# Altium footprint library ConnectMedical.PcbLib: 93 footprints (part 6 of 6)
Each footprint in its own frame and in the unit in brackets; x right, y up, seen from the top. Pads: shape width x height; smd on the part's side, far side on the other; paste and mask are expansions set on the pad; w line width, h text height; cw(c..) or ccw(c..) is an arc to the next point about the centre after c.
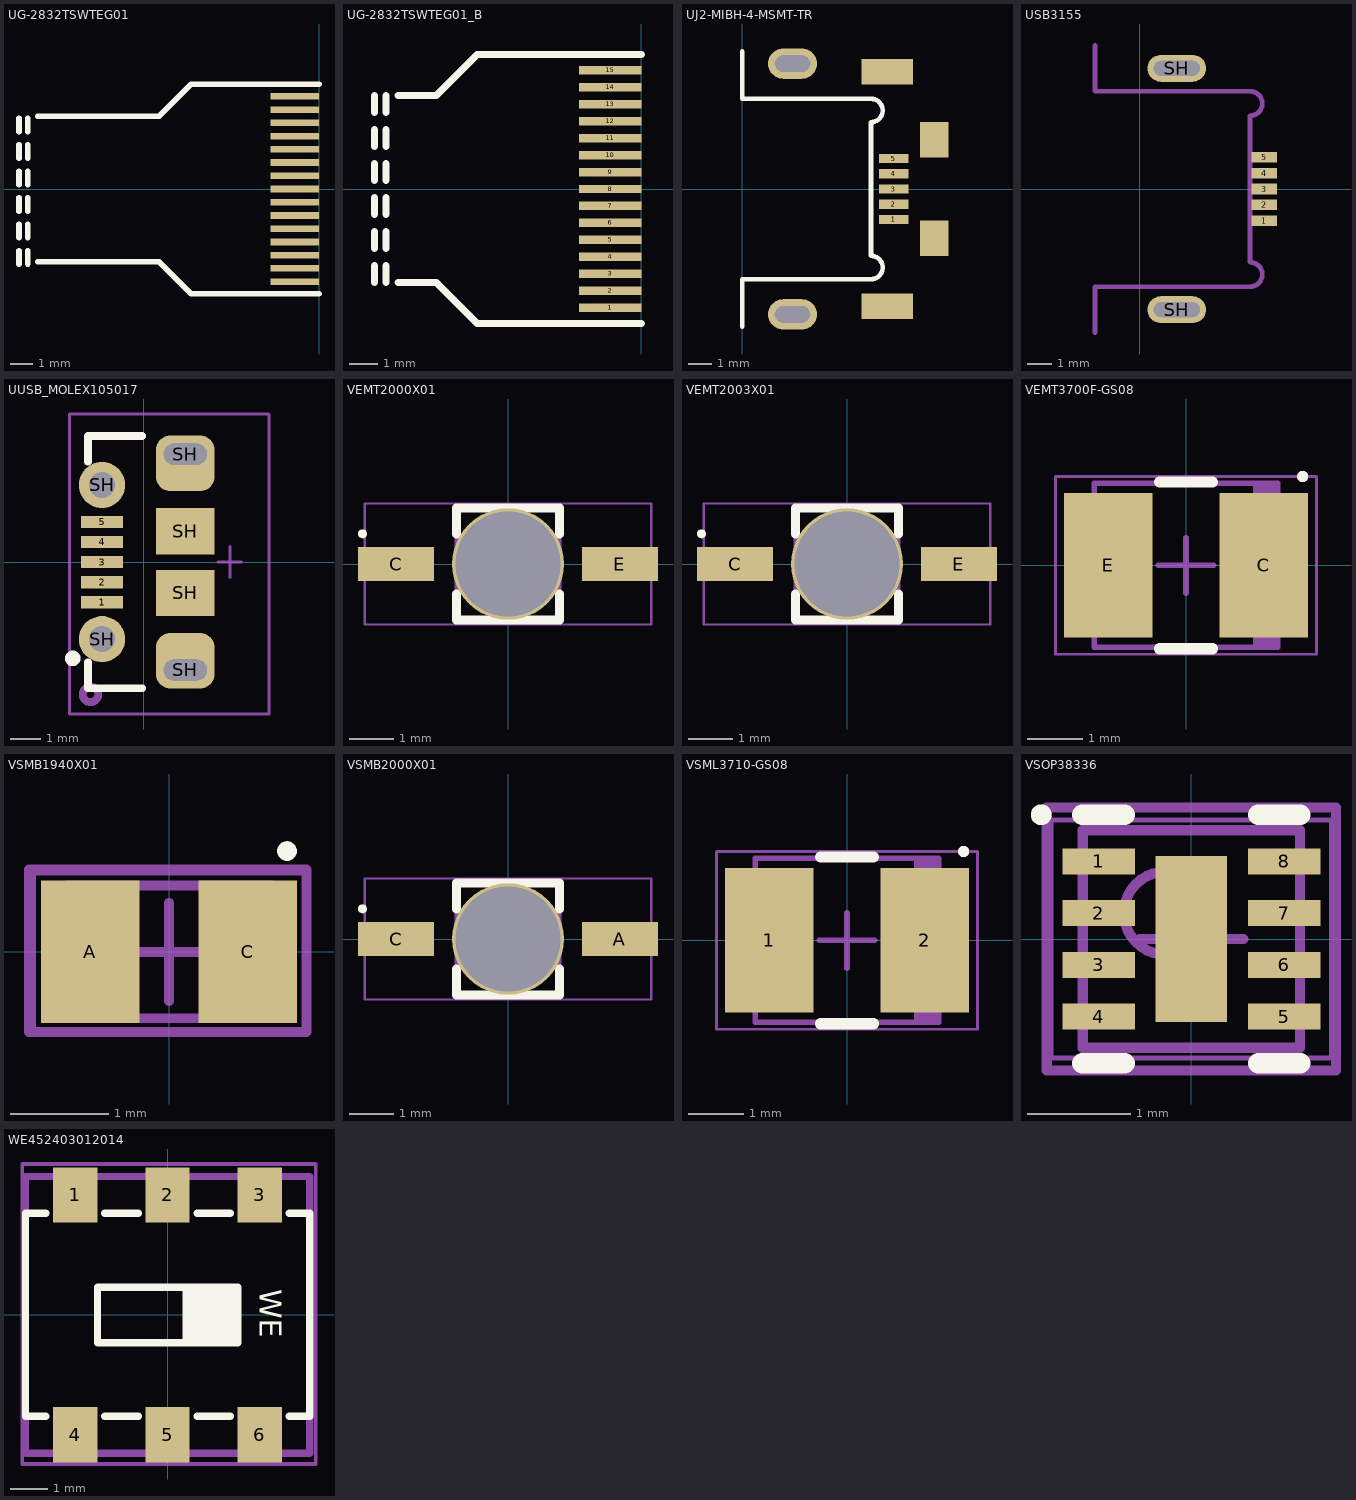
[diagram p5: the footprints below, top view; thin cyan lines are the x and y axes]

## UG-2832TSWTEG01 [mm] "OLED Display"
pads (15):
  rect 2.2x0.3 smd: 1(-1.1,-4.2) 2(-1.1,-3.6) 3(-1.1,-3) 4(-1.1,-2.4) 5(-1.1,-1.8) 6(-1.1,-1.2) 7(-1.1,-0.6) 8(-1.1,0) 9(-1.1,0.6) 10(-1.1,1.2) 11(-1.1,1.8) 12(-1.1,2.4) 13(-1.1,3) 14(-1.1,3.6) 15(-1.1,4.2)
Top Overlay:
  lines w0.254: -13.6,-3.4 -13.6,-2.8 ; -13.6,-2.2 -13.6,-1.6 ; -13.6,-1 -13.6,-0.4 ; -13.6,0.2 -13.6,0.8 ; -13.6,1.4 -13.6,2 ; -13.6,2.6 -13.6,3.2 ; -13.2,-3.4 -13.2,-2.8 ; -13.2,-2.2 -13.2,-1.6 ; -13.2,-1 -13.2,-0.4 ; -13.2,0.2 -13.2,0.8 ; -13.2,1.4 -13.2,2 ; -13.2,2.6 -13.2,3.2 ; -12.75,-3.3 -7.25,-3.3 -5.8,-4.75 0,-4.75 ; -12.75,3.3 -7.25,3.3 -5.8,4.75 0,4.75

## UG-2832TSWTEG01_B [mm] "OLED Display"
pads (15):
  rect 2.2x0.3 smd: 1(-1.1,-4.2) 2(-1.1,-3.6) 3(-1.1,-3) 4(-1.1,-2.4) 5(-1.1,-1.8) 6(-1.1,-1.2) 7(-1.1,-0.6) 8(-1.1,0) 9(-1.1,0.6) 10(-1.1,1.2) 11(-1.1,1.8) 12(-1.1,2.4) 13(-1.1,3) 14(-1.1,3.6) 15(-1.1,4.2)
Top Overlay:
  lines w0.254: -9.425,-3.3 -9.425,-2.7 ; -9.425,-2.1 -9.425,-1.5 ; -9.425,-0.9 -9.425,-0.3 ; -9.425,0.3 -9.425,0.9 ; -9.425,1.5 -9.425,2.1 ; -9.425,2.7 -9.425,3.3 ; -9.025,-3.3 -9.025,-2.7 ; -9.025,-2.1 -9.025,-1.5 ; -9.025,-0.9 -9.025,-0.3 ; -9.025,0.3 -9.025,0.9 ; -9.025,1.5 -9.025,2.1 ; -9.025,2.7 -9.025,3.3 ; -8.6,-3.3 -7.25,-3.3 -5.8,-4.75 0,-4.75 ; -8.6,3.3 -7.25,3.3 -5.8,4.75 0,4.75

## UJ2-MIBH-4-MSMT-TR [mm] "USB Connector"
pads (11):
  rect 1.25x0.4 smd: 1(6.475,-1.3) 2(6.475,-0.65) 3(6.475,0) 4(6.475,0.65) 5(6.475,1.3)
  oval 2.1x1.3 hole 0.7 slot 1.5 at 0 deg: ""(2.15,-5.35) ""(2.15,5.35)
  rect 2.2x1.1 smd: ""(6.2,-5) ""(6.2,5)
  rect 1.2x1.5 smd: ""(8.2,-2.1) ""(8.2,2.1)
Top Overlay:
  lines w0.2: 0,-5.875 0,-3.85 5.5,-3.85 ccw(c5.5,-3.35) 5.5,-2.85 5.5,2.85 ccw(c5.5,3.35) 5.5,3.85 0,3.85 0,5.875
3D body "UJ2-MIBH-4-MSMT_AP203.stp": height 0.9, standoff -1.81, extent 0.025,-5.5 8.725,5.5

## USB3155 [mm] "USB Connector"
pads (7):
  rect 1.05x0.43 smd mask+0.07: 1(5.1,-1.3) 2(5.1,-0.65) 3(5.1,0) 4(5.1,0.65) 5(5.1,1.3)
  oval 2.4x1.1 hole 0.6 slot 1.9 at 0 deg: SH(1.52,-4.94) SH(1.52,4.94)
Mechanical 15:
  lines w0.2: -1.83,-5.875 -1.83,-4 4.52,-4 ccw(c4.52,-3.5) 4.52,-3 4.52,3 ccw(c4.52,3.5) 4.52,4 -1.83,4 -1.83,5.875
3D body "USB3155-30-A_revB v1.step": height 0.31, standoff -2.5, extent -1.143,-5.09 5.275,5.09

## UUSB_MOLEX105017 [mm] "Micro-USB Molex 105017-0001 B Receptacle, Solder Tab, Lead-Free"
height 2.7
pads (11):
  rect 1.35x0.4 smd mask+0.102: 1(-1.35,-1.3)
  rect 1.35x0.4 smd: 2(-1.35,-0.65) 3(-1.35,0) 4(-1.35,0.65) 5(-1.35,1.3)
  round 1.5 hole 0.85: SH(-1.35,-2.5) SH(-1.35,2.5)
  rrect50% 1.9x1.8 hole 0.7 slot 1.4 at 0 deg copper offset 0,0.3 mask+0.102: SH(1.35,-3.5)
  rect 1.9x1.5 smd: SH(1.35,-1) SH(1.35,1)
  rrect50% 1.9x1.8 hole 0.7 slot 1.4 at 0 deg copper offset 0,-0.3 mask+0.102: SH(1.35,3.5)
Top Overlay:
  circle w0.254: c-2.3,-3.125 r0.125
  lines w0.254: -1.8,-3.25 -1.8,-4.09 -0.05,-4.09 ; -1.8,3.25 -1.8,4.09 -0.05,4.09
Mechanical 14:
  circle w0.254: c-1.723,-4.293 r0.251
  lines w0.1: -2.409,-4.928 4.068,-4.928 4.068,4.775 4.043,4.801 -2.409,4.801 -2.409,-4.928
  text ".designator" at -0.332,-0.497 h0.76
Mechanical 15:
  lines w0.1: 2.417,0 3.179,0 ; 2.8,-0.5 2.8,0.5 ; -2.409,-4.928 -2.409,4.801 4.043,4.801 4.068,4.775 4.068,-4.928 -2.409,-4.928
3D body "1050170001.stp": height 2.68, standoff -0.62, extent -1.492,-4.075 3.908,4.125

## VEMT2000X01 [mm] "Silicon NPN Phototransistor, 2-Leads, Body 2.30x5.80mm, IPC High Density"
height 2.97
pads (3):
  rect 1.7x0.75 smd: C(-2.5,0) E(2.5,0)
  round 2.5 hole 2.35: ""(0,0)
Top Overlay:
  circle w0.1: c-3.25,0.675 r0.05
  lines w0.2: -1.15,-0.675 -1.15,-1.25 1.15,-1.25 1.15,-0.675 ; -1.15,0.675 -1.15,1.25 1.15,1.25 1.15,0.675
Mechanical 13:
  lines w0.1: -1.15,-1.25 1.15,-1.25 1.15,1.25 -1.15,1.25 -1.15,-1.25
Mechanical 15:
  lines w0.05: -3.2,-1.35 3.2,-1.35 3.2,1.35 -3.2,1.35 -3.2,-1.35
  lines w0.1: -0.5,0 0.5,0 ; 0,-0.5 0,0.5
3D body "VEMT2000x01.step": height 1.8, standoff -0.97, extent -2.9,-1.15 2.9,1.15

## VEMT2003X01 [mm] "Silicon NPN Phototransistor, SODFL, 2-Leads, Body 2.30x5.80mm, IPC High Density"
height 2.75
pads (3):
  rect 1.7x0.75 smd: C(-2.5,0) E(2.5,0)
  round 2.5 hole 2.35: ""(0,0)
Top Overlay:
  circle w0.1: c-3.25,0.675 r0.05
  lines w0.2: -1.15,-0.675 -1.15,-1.25 1.15,-1.25 1.15,-0.675 ; -1.15,0.675 -1.15,1.25 1.15,1.25 1.15,0.675
Mechanical 13:
  lines w0.1: -1.15,-1.25 1.15,-1.25 1.15,1.25 -1.15,1.25 -1.15,-1.25
Mechanical 15:
  lines w0.05: -3.2,-1.35 3.2,-1.35 3.2,1.35 -3.2,1.35 -3.2,-1.35
  lines w0.1: -0.5,0 0.5,0 ; 0,-0.5 0,0.5
3D body "VEMT2003x01.step": height 1.6, standoff -0.95, extent -2.9,-1.15 2.9,1.15

## VEMT3700F-GS08 [mm] "Silicon NPN Phototransistor, 2-Leads, Body 3.50x2.80mm, IPC High Density"
height 1.85
pads (2):
  rect 1.6x2.6 smd: C(1.4,0) E(-1.4,0)
Top Overlay:
  circle w0.1: c2.1,1.6 r0.05
  lines w0.2: -0.475,-1.5 0.475,-1.5 ; -0.475,1.5 0.475,1.5
Mechanical 13:
  rectangle: 1.206,-1.475 1.65,1.475
  lines w0.1: -1.65,-1.475 -1.65,1.475 1.65,1.475 1.65,-1.475 -1.65,-1.475
Mechanical 15:
  lines w0.05: -2.35,-1.6 -2.35,1.6 2.35,1.6 2.35,-1.6 -2.35,-1.6
  lines w0.1: -0.5,0 0.5,0 ; 0,-0.5 0,0.5
3D body "VSML3710-GS08.step": height 1.85, standoff 0, extent -1.87,-1.475 1.87,1.475

## VSMB1940X01 [mm] "High Speed Infrared Emitting Diode, 2-Leads, Body 2.00x1.25mm, IPC High Density"
height 0.95
pads (2):
  rect 1x1.45 smd: A(-0.8,0) C(0.8,0)
Top Overlay:
  circle w0.1: c1.2,1.025 r0.05
Mechanical 13:
  rectangle: 0.768,-0.675 1.05,0.675
  lines w0.1: -1.05,-0.675 1.05,-0.675 1.05,0.675 -1.05,0.675 -1.05,-0.675
Mechanical 14:
  lines w0.1: -1.422,-0.813 1.397,-0.813 1.397,0.838 -1.422,0.838 -1.422,-0.813
  text "'.Designator'" at -1.676,-0.381 h0.76
Mechanical 15:
  lines w0.05: -1.375,-0.8 1.375,-0.8 1.375,0.8 -1.375,0.8 -1.375,-0.8
  lines w0.1: -0.5,0 0.5,0 ; 0,-0.5 0,0.5
3D body "TEMD7100X01 .step": height 0.95, standoff 0, extent -1.27,-0.675 1.27,0.675

## VSMB2000X01 [mm] "High Speed Infrared Emitting Diodes, 2-Leads, Body 2.30x5.80mm, IPC High Density"
height 2.97
pads (3):
  rect 1.7x0.75 smd: A(2.5,0) C(-2.5,0)
  round 2.5 hole 2.35: ""(0,0)
Top Overlay:
  circle w0.1: c-3.25,0.675 r0.05
  lines w0.2: -1.15,-0.675 -1.15,-1.25 1.15,-1.25 1.15,-0.675 ; -1.15,0.675 -1.15,1.25 1.15,1.25 1.15,0.675
Mechanical 13:
  lines w0.1: -1.15,-1.25 -1.15,1.25 1.15,1.25 1.15,-1.25 -1.15,-1.25
Mechanical 15:
  lines w0.05: -3.2,-1.35 -3.2,1.35 3.2,1.35 3.2,-1.35 -3.2,-1.35
  lines w0.1: -0.5,0 0.5,0 ; 0,-0.5 0,0.5
3D body "VEMB2000x01.step": height 1.8, standoff -0.97, extent -2.9,-1.15 2.9,1.15

## VSML3710-GS08 [mm] "High Power Infrared Emitting Diode, 2-Leads, Body 3.50x2.80mm, IPC High Density"
height 1.85
pads (2):
  rect 1.6x2.6 smd: 1(-1.4,0) 2(1.4,0)
Top Overlay:
  circle w0.1: c2.1,1.6 r0.05
  lines w0.2: -0.475,-1.5 0.475,-1.5 ; -0.475,1.5 0.475,1.5
Mechanical 13:
  rectangle: 1.206,-1.475 1.65,1.475
  lines w0.1: -1.65,-1.475 -1.65,1.475 1.65,1.475 1.65,-1.475 -1.65,-1.475
Mechanical 15:
  lines w0.05: -2.35,-1.6 -2.35,1.6 2.35,1.6 2.35,-1.6 -2.35,-1.6
  lines w0.1: -0.5,0 0.5,0 ; 0,-0.5 0,0.5
3D body "VSML3710-GS08.step": height 1.85, standoff 0, extent -1.87,-1.475 1.87,1.475

## VSOP38336 [mm] "SON, 8-Leads, Body 2.00x2.00mm, Pitch 0.50mm, Thermal Pad 1.60x0.69mm, IPC High Density"
height 0.81
pads (9):
  rect 0.7x0.25 smd: 1(-0.895,0.75) 2(-0.895,0.25) 3(-0.895,-0.25) 4(-0.895,-0.75) 5(0.895,-0.75) 6(0.895,-0.25) 7(0.895,0.25) 8(0.895,0.75)
  rect 0.69x1.6 smd: ""(0,0)
Top Overlay:
  circle w0.1: c-1.45,1.2 r0.05
  lines w0.2: -1.05,-1.2 -0.645,-1.2 ; -1.05,1.2 -0.645,1.2 ; 0.645,-1.2 1.05,-1.2 ; 0.645,1.2 1.05,1.2
Mechanical 13:
  circle w0.1: c-0.25,0.25 r0.4
  lines w0.1: -1.05,-1.05 1.05,-1.05 1.05,1.05 -1.05,1.05 -1.05,-1.05
Mechanical 14:
  lines w0.1: -1.397,-1.27 1.397,-1.27 1.397,1.27 -1.397,1.27 -1.397,-1.27
  text "'.Designator'" at -1.499,-0.406 h0.76
Mechanical 15:
  lines w0.05: -1.355,-1.15 1.355,-1.15 1.355,1.15 -1.355,1.15 -1.355,-1.15
  lines w0.1: -0.5,0 0.5,0 ; 0,-0.5 0,0.5
3D body "VSOP383.step": height 0.81, standoff 0, extent -1.051,-1.05 1.051,1.05

## WE452403012014 [mm] "WS-SLSV Slide Switch, SMD version, same side connection"
height 3.3
pads (6):
  rect 1.2x1.5 smd: 1(-2.5,3.25) 2(0,3.25) 3(2.5,3.25) 4(-2.5,-3.25) 5(0,-3.25) 6(2.5,-3.25)
Top Overlay:
  rectangle: 0.4,-0.75 1.9,0.75
  lines w0.2: -3.3,-2.75 -3.85,-2.75 -3.85,2.75 -3.3,2.75 ; -1.7,-2.75 -0.8,-2.75 ; -1.7,2.75 -0.8,2.75 ; 0.8,-2.75 1.7,-2.75 ; 0.8,2.75 1.7,2.75 ; 3.3,-2.75 3.85,-2.75 3.85,2.75 3.3,2.75 ; -1.9,-0.75 1.9,-0.75 1.9,0.75 -1.9,0.75 -1.9,-0.75
  text "WE" at 2.3,0.7 h1.02
Mechanical 13:
  lines w0.2: -3.85,-3.75 3.85,-3.75 3.85,3.75 -3.85,3.75 -3.85,-3.75
Mechanical 14:
  lines w0.1: -3.937,-4.039 4.013,-4.039 4.013,4.089 -3.937,4.089 -3.937,-4.039
  text "'.Designator'" at -2.235,-0.406 h0.76
3D body "452403012014.stp": height 3.48, standoff 0, extent -3.85,-3.75 3.85,3.75